# Altium footprint library 04.连接器件.pcb.PCBLIB: 363 footprints (part 8 of 23)
Each footprint in its own frame and in the unit in brackets; x right, y up, seen from the top. Pads: shape width x height; smd on the part's side, far side on the other; paste and mask are expansions set on the pad; w line width, h text height; cw(c..) or ccw(c..) is an arc to the next point about the centre after c.
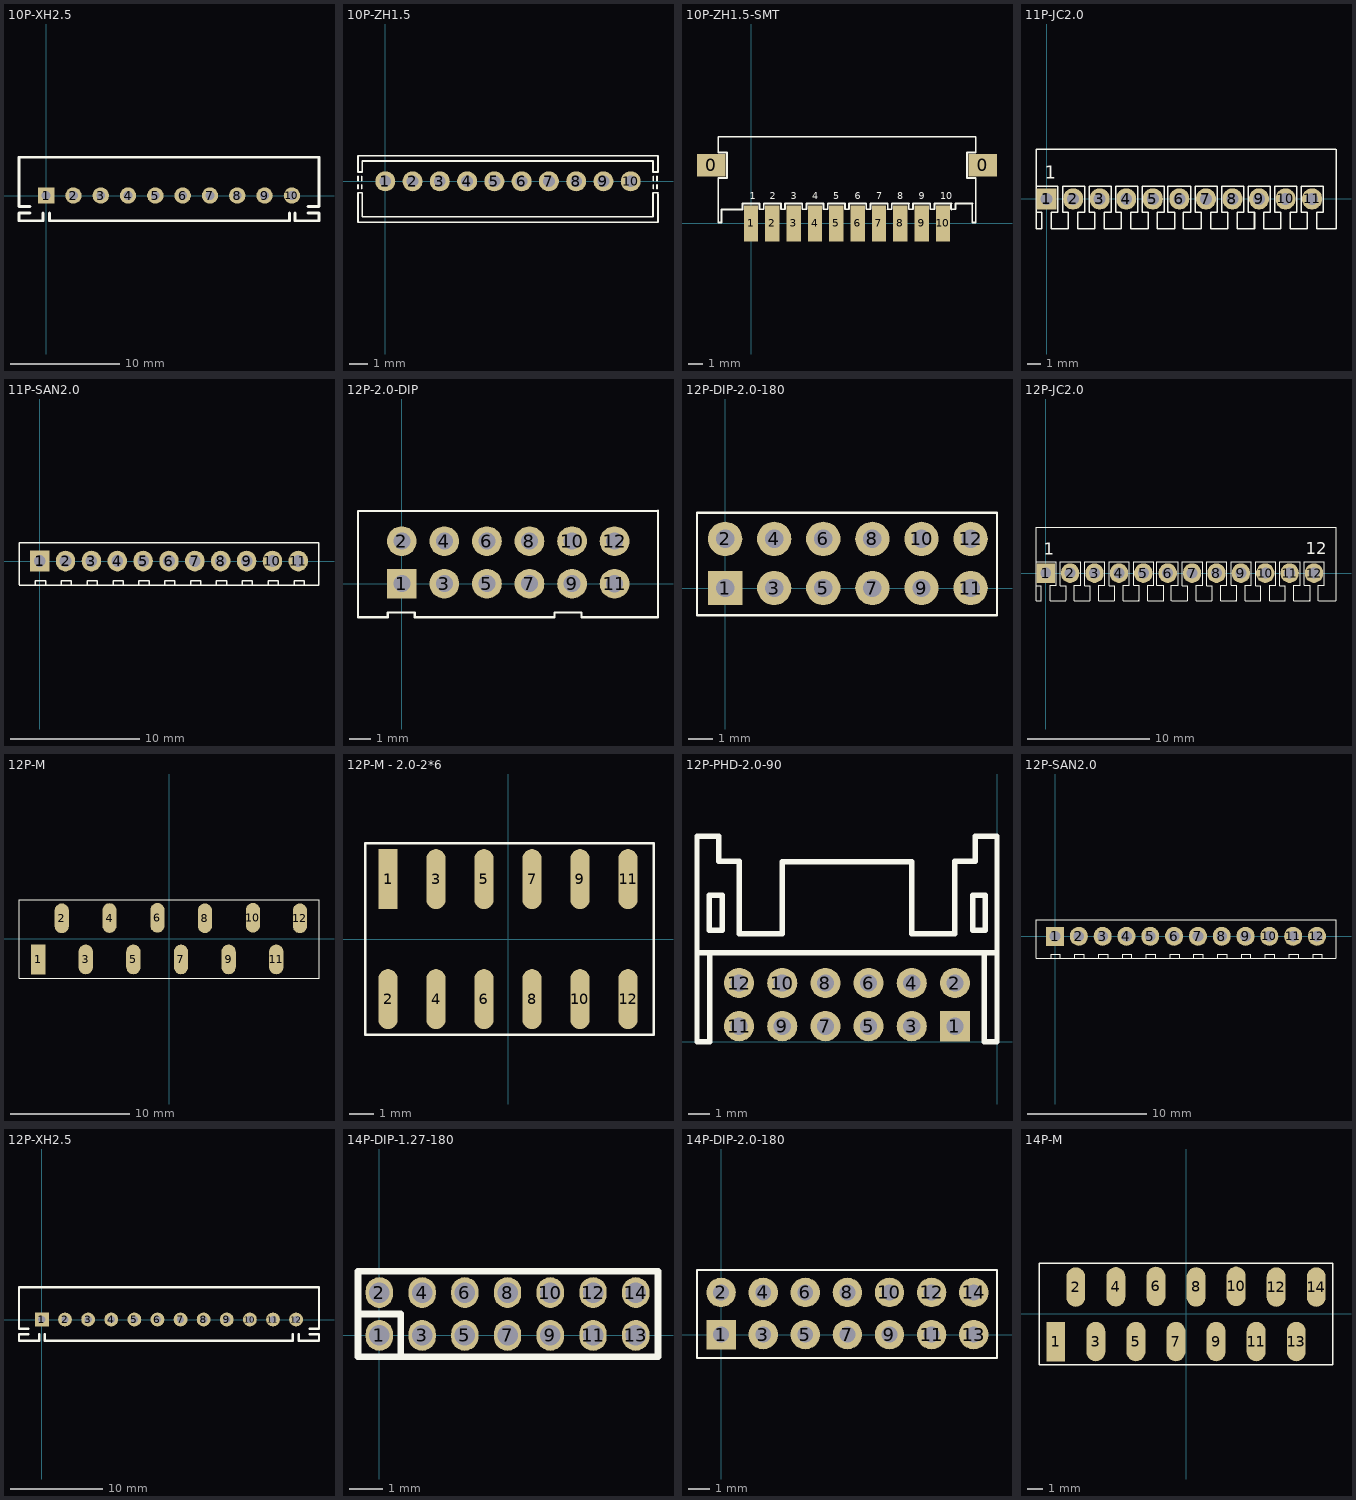
[diagram p7: the footprints below, top view; thin cyan lines are the x and y axes]

## 10P-XH2.5 [mm]
pads (10):
  rect 1.5x1.5 hole 0.8: 1(0,0)
  round 1.5 hole 0.8: 2(2.5,0) 3(5,0) 4(7.5,0) 5(10,0) 6(12.5,0) 7(15,0) 8(17.5,0) 9(20,0) 10(22.5,0)
TopOverlay:
  lines w0.254: -1.48,-1.6 -2.48,-1.6 -2.48,-2.3 -0.58,-2.3 ; -1.48,-1 -2.48,-1 -2.48,3.5 5.02,3.5 ; -0.88,-2.3 -0.28,-2.3 -0.28,-1.6 ; 0.32,-1.6 0.32,-2.3 0.62,-2.3 1.62,-2.3 22.12,-2.3 ; 4.42,3.5 24.943,3.5 ; 22.02,-2.3 22.276,-2.3 22.276,-1.6 ; 22.78,-1.6 22.78,-2.3 23.38,-2.3 ; 23.08,-2.3 24.98,-2.3 24.98,-1.6 23.98,-1.6 ; 23.98,-1 24.98,-1 24.98,3.5
3D body "10PIN-XH2.5.STEP": height 5.9, standoff -3.47, extent -2.54,-2.286 24.86,3.464

## 10P-ZH1.5 [mm]
pads (10):
  round 1.1 hole 0.65: 1(0,0) 2(1.5,0) 3(3,0) 4(4.5,0) 5(6,0) 6(7.5,0) 7(9,0) 8(10.5,0) 9(12,0) 10(13.5,0)
TopOverlay:
  lines w0.1: -1.499,-0.406 -1.499,-0.203 ; -1.499,0.051 -1.499,0.279 ; -1.295,-0.406 -1.295,-0.203 ; -1.295,0.051 -1.295,0.279 ; 14.742,-0.406 14.742,-0.203 ; 14.742,0.051 14.742,0.279 ; 14.945,-0.406 14.945,-0.203 ; 14.945,0.051 14.945,0.279 ; 14.991,1.4 15,1.391 15,0.508 14.716,0.508 14.716,1.118 -1.27,1.118 -1.27,0.508 -1.5,0.508 -1.5,1.4 15,1.4 ; 15,-0.682 15,-2.25 -1.5,-2.25 -1.5,-0.635 -1.27,-0.635 -1.27,-1.956 14.716,-1.956 14.716,-0.635 15,-0.635
3D body "10P-ZH1.5.STEP": height 4.6, standoff -2.45, extent -1.544,-2.261 14.956,1.389

## 10P-ZH1.5-SMT [mm]
pads (12):
  rect 2x1.6 smd: 0(-2.8,4.1) 0(16.3,4.1)
  rect 1x2.5 smd: 1(0,0) 2(1.5,0) 3(3,0) 4(4.5,0) 5(6,0) 6(7.5,0) 7(9,0) 8(10.5,0) 9(12,0) 10(13.5,0)
TopOverlay:
  lines w0.1: 8.1,1 8.1,1.4 ; 9.6,1 9.6,1.4 ; 11.1,1 11.1,1.4 ; 12.599,1 12.599,1.399 ; 15.57,0.07 15.57,1.398
  lines w0.127: 8.1,1 8.4,1 ; 8.1,1.4 6.9,1.4 6.9,1 6.6,1 6.6,1.4 5.4,1.4 5.4,1 5.1,1 5.1,1.4 3.9,1.4 3.9,1 3.6,1 3.6,1.4 2.4,1.4 2.4,1 2.1,1 2.1,1.4 0.9,1.4 0.9,1 0.6,1 0.6,1.4 -0.6,1.4 -0.6,1 -0.61,0.99 -2.07,0.99 -2.07,0.07 -2.3,0.07 -2.3,3.2 -1.7,3.2 -1.7,5 -2.3,5 -2.3,6.1 11.2,6.1 12.8,6.1 ; 9.6,1 9.9,1 ; 11.1,1 11.4,1 11.4,1.4 12.6,1.4 ; 12.599,1 12.899,1 12.899,1.4 14.099,1.4 ; 12.7,6.1 15.773,6.1 ; 14.072,1.4 14.072,1 ; 15.57,0.07 15.8,0.07 15.8,3.2 15.2,3.2 15.2,5 15.8,5 15.8,6.1 ; 15.572,1.4 14.372,1.4 14.372,1 14.072,1 ; 8.4,1 8.4,1.4 ; 8.4,1 8.4,1.4 ; 8.4,1.4 9.6,1.4 8.4,1.4 ; 9.9,1 9.9,1.4 ; 9.9,1 9.9,1.4 ; 9.9,1 9.9,1.4 ; 9.9,1.4 11.1,1.4 ; 9.9,1.4 11.1,1.4 ; 9.9,1.4 11.1,1.4 ; 14.072,1 14.082,0.99 ; 14.072,1 14.082,0.99 ; 14.072,1 14.082,0.99 ; 14.099,1 14.109,0.99 14.099,1
  text "8" at 10.3,1.7 h0.5
  text "5" at 5.8,1.7 h0.5
  text "4" at 4.3,1.7 h0.5
  text "3" at 2.8,1.7 h0.5
  text "2" at 1.3,1.7 h0.5
  text "1" at -0.1,1.7 h0.5
  text "7" at 8.8,1.7 h0.5
  text "6" at 7.3,1.7 h0.5
  text "9" at 11.8,1.7 h0.5
  text "10" at 13.299,1.7 h0.5
3D body "10P-ZH1.5-SMT.STEP": height 3.7, standoff -0.25, extent -2.337,-0.483 15.663,6.017

## 11P-JC2.0 [mm]
pads (11):
  rect 1.5x1.6 hole 0.9: 1(0,0)
  oval 1.5x1.6 hole 0.9: 2(2,0) 3(4,0) 4(6,0) 5(8,0) 6(10,0) 7(12,0) 8(14,0) 9(16,0) 10(18,0) 11(20,0)
TopOverlay:
  lines w0.1: 1.623,-2.25 0.349,-2.25 0.349,-0.991 0.857,-0.991 0.857,0.94 -0.8,0.94 ; 1.638,-2.235 1.638,-1.016 1.2,-1.016 1.2,0.94 2.857,0.94 2.857,-0.991 2.349,-0.991 2.349,-2.25 3.2,-2.25 3.623,-2.25 3.638,-2.235 3.638,-1.016 3.2,-1.016 3.2,0.94 4.857,0.94 4.857,-0.991 4.349,-0.991 4.349,-2.25 5.623,-2.25 5.638,-2.235 5.638,-1.016 5.2,-1.016 5.2,0.94 6.857,0.94 6.857,-0.991 6.349,-0.991 6.349,-2.25 7.67,-2.25 7.67,-0.991 7.2,-0.991 7.2,0.94 8.857,0.94 8.857,-0.991 8.349,-0.991 8.349,-2.25 9.67,-2.25 9.67,-0.991 9.111,-0.991 9.111,0.94 10.864,0.94 10.864,-0.991 10.305,-0.991 ; 7.623,-2.25 7.638,-2.235 ; 10.289,-2.25 10.289,-1.005 ; 10.349,-2.25 11.2,-2.25 11.623,-2.25 11.638,-2.235 11.638,-1.016 11.2,-1.016 11.2,0.94 12.857,0.94 12.857,-0.991 12.349,-0.991 12.349,-2.25 13.623,-2.25 13.638,-2.235 13.638,-1.016 13.2,-1.016 13.2,0.94 14.857,0.94 14.857,-0.991 14.349,-0.991 14.349,-2.25 15.67,-2.25 15.67,-0.991 15.2,-0.991 15.2,0.94 16.857,0.94 ; 10.349,-0.991 10.857,-0.991 10.857,0.94 ; 15.623,-2.25 15.638,-2.235 15.638,-1.016 ; 21.793,3.75 -0.8,3.75 -0.8,0.94 ; 21.8,3.75 21.8,-2.228 21.778,-2.25 20.349,-2.25 20.349,-0.991 20.857,-0.991 20.857,0.94 19.2,0.94 19.2,-1.016 19.638,-1.016 19.638,-2.235 19.623,-2.25 18.349,-2.25 18.349,-0.991 18.857,-0.991 18.857,0.94 17.2,0.94 17.2,-1.016 17.638,-1.016 17.638,-2.235 17.623,-2.25 17.2,-2.25 16.349,-2.25 ; -0.8,-1.016 -0.8,-2.25 -0.377,-2.25 -0.362,-2.235 -0.362,-1.016 -0.8,-1.016 ; -0.8,-1.016 -0.8,0.94 ; 16.349,-2.25 16.349,-0.991 ; 16.349,-2.25 16.349,-0.991 ; 16.349,-0.991 16.857,-0.991 ; 16.349,-0.991 16.857,-0.991 ; 16.857,-0.991 16.857,0.94 ; 16.857,-0.991 16.857,0.94
  text "1" at -0.152,1.524 h1
3D body "11P-JC2.0.STEP": height 3.4, standoff -3.22, extent -1.219,-7.163 21.281,3.837

## 11P-SAN2.0 [mm]
pads (11):
  rect 1.5x1.6 hole 0.9: 1(0,0)
  oval 1.5x1.6 hole 0.9: 2(2,0) 3(4,0) 4(6,0) 5(8,0) 6(10,0) 7(12,0) 8(14,0) 9(16,0) 10(18,0) 11(20,0)
TopOverlay:
  lines w0.1: -1.6,-1.85 -1.6,1.4 21.59,1.4 ; -1.575,-1.854 21.565,-1.854 ; -0.33,-1.85 -0.33,-1.524 0.457,-1.524 0.457,-1.85 ; 1.67,-1.85 1.67,-1.524 2.457,-1.524 2.457,-1.85 ; 3.67,-1.85 3.67,-1.524 4.457,-1.524 4.457,-1.85 ; 5.67,-1.85 5.67,-1.524 6.457,-1.524 6.457,-1.85 ; 7.67,-1.85 7.67,-1.524 8.457,-1.524 8.457,-1.85 ; 9.67,-1.85 9.67,-1.524 10.457,-1.524 10.457,-1.85 ; 11.67,-1.85 11.67,-1.524 12.457,-1.524 12.457,-1.85 ; 13.67,-1.85 13.67,-1.524 14.457,-1.524 14.457,-1.85 ; 15.67,-1.85 15.67,-1.524 16.457,-1.524 16.457,-1.85 ; 17.67,-1.85 17.67,-1.524 18.457,-1.524 18.457,-1.85 ; 19.67,-1.85 19.67,-1.524 20.457,-1.524 20.457,-1.85 ; 21.592,-1.85 21.6,-1.842 ; 21.601,-1.854 21.601,1.397
3D body "11P-SAN2.0.STEP": height 11, standoff -3.19, extent -1.6,-1.88 21.6,1.37

## 12P-2.0-DIP [mm]
pads (12):
  rect 1.4x1.4 hole 0.8: 1(0,0)
  round 1.4 hole 0.8: 2(0,2) 3(2,0) 4(2,2) 5(4,0) 6(4,2) 7(6,0) 8(6,2) 9(8,0) 10(8,2) 11(10,0) 12(10,2)
TopOverlay:
  lines w0.1: -2.057,-1.575 -0.66,-1.575 -0.66,-1.346 0.61,-1.346 0.61,-1.575 7.182,-1.575 7.182,-1.346 8.452,-1.346 8.452,-1.575 12.04,-1.575 12.04,3.43 -2.057,3.425 -2.057,-1.575
3D body: height 6.5, standoff 0, extent -2.057,-1.575 12.04,3.43

## 12P-DIP-2.0-180 [mm]
pads (12):
  rect 1.4x1.4 hole 0.75: 1(0,0)
  round 1.4 hole 0.75: 2(0,2) 3(2,0) 4(2,2) 5(4,0) 6(4,2) 7(6,0) 8(6,2) 9(8,0) 10(8,2) 11(10,0) 12(10,2)
TopOverlay:
  lines w0.1: -1.143,-1.118 11.074,-1.118 11.074,3.073 -1.143,3.073 -1.143,-1.118

## 12P-JC2.0 [mm]
pads (12):
  rect 1.5x1.6 hole 0.9: 1(0,0)
  oval 1.5x1.6 hole 0.9: 2(2,0) 3(4,0) 4(6,0) 5(8,0) 6(10,0) 7(12,0) 8(14,0) 9(16,0) 10(18,0) 11(20,0) 12(22,0)
TopOverlay:
  lines w0.1: 1.623,-2.25 0.349,-2.25 0.349,-0.991 0.857,-0.991 0.857,0.94 -0.8,0.94 ; 1.638,-2.235 1.638,-1.016 1.2,-1.016 1.2,0.94 2.857,0.94 2.857,-0.991 2.349,-0.991 2.349,-2.25 3.2,-2.25 3.623,-2.25 3.638,-2.235 3.638,-1.016 3.2,-1.016 3.2,0.94 4.857,0.94 4.857,-0.991 4.349,-0.991 4.349,-2.25 5.623,-2.25 5.638,-2.235 5.638,-1.016 5.2,-1.016 5.2,0.94 6.857,0.94 6.857,-0.991 6.349,-0.991 6.349,-2.25 7.67,-2.25 7.67,-0.991 7.2,-0.991 7.2,0.94 8.857,0.94 8.857,-0.991 8.349,-0.991 8.349,-2.25 9.67,-2.25 9.67,-0.991 9.111,-0.991 9.111,0.94 10.864,0.94 10.864,-0.991 10.305,-0.991 ; 7.623,-2.25 7.638,-2.235 ; 10.289,-2.25 10.289,-1.005 ; 10.349,-2.25 11.2,-2.25 11.623,-2.25 11.638,-2.235 11.638,-1.016 11.2,-1.016 11.2,0.94 12.857,0.94 12.857,-0.991 12.349,-0.991 12.349,-2.25 13.623,-2.25 13.638,-2.235 13.638,-1.016 13.2,-1.016 13.2,0.94 14.857,0.94 14.857,-0.991 14.349,-0.991 14.349,-2.25 15.67,-2.25 15.67,-0.991 15.2,-0.991 15.2,0.94 16.857,0.94 ; 10.349,-0.991 10.857,-0.991 10.857,0.94 ; 15.623,-2.25 15.638,-2.235 15.638,-1.016 ; 21.2,-2.25 21.623,-2.25 21.638,-2.235 ; 22.349,-2.25 22.349,-0.991 22.857,-0.991 22.857,0.94 21.2,0.94 21.2,-0.991 21.67,-0.991 21.67,-2.25 20.349,-2.25 20.349,-0.991 20.857,-0.991 20.857,0.94 19.2,0.94 19.2,-1.016 19.638,-1.016 19.638,-2.235 19.623,-2.25 18.349,-2.25 18.349,-0.991 18.857,-0.991 18.857,0.94 17.2,0.94 17.2,-1.016 17.638,-1.016 17.638,-2.235 17.623,-2.25 17.2,-2.25 16.349,-2.25 ; 22.38,-2.25 23.79,-2.25 ; 23.8,-2.25 23.8,3.75 -0.8,3.75 -0.8,0.94 ; -0.8,-1.016 -0.362,-1.016 -0.362,-2.235 -0.377,-2.25 -0.8,-2.25 -0.8,-1.016 ; -0.8,-1.016 -0.8,0.94 ; 16.349,-2.25 16.349,-0.991 ; 16.349,-2.25 16.349,-0.991 ; 16.349,-0.991 16.857,-0.991 ; 16.349,-0.991 16.857,-0.991 ; 16.857,-0.991 16.857,0.94 ; 16.857,-0.991 16.857,0.94
  text "12" at 21.336,1.549 h1
  text "1" at -0.152,1.524 h1
3D body "12P-JC2.0.STEP": height 3.4, standoff -3.22, extent -1.245,-7.214 23.255,3.786

## 12P-M [mm]
pads (12):
  rect 1.2x2.5 smd: 1(-10.995,-1.748)
  oval 1.2x2.5 smd: 2(-9.009,1.703) 3(-6.995,-1.748) 4(-4.998,1.721) 5(-2.995,-1.748) 6(-0.972,1.744) 7(1.005,-1.748) 8(3.017,1.712) 9(5.005,-1.748) 10(7.047,1.748) 11(9.005,-1.748) 12(10.995,1.703)
TopLayer:
  lines w0.1: 3.008,2.703 3.017,1.712 ; 7.008,2.481 7.047,1.748
TopOverlay:
  lines w0.1: 12.59,-0.371 12.598,-0.379 ; -12.602,-3.315 -12.602,3.247 12.599,3.247 12.599,-3.315 -12.602,-3.315
3D body "12P-SAN2.0.STEP": height 11, standoff -3.19, extent -12.68,-1.706 12.52,1.543

## 12P-M - 2.0-2*6 [mm]
pads (12):
  rect 0.8x2.5 smd: 1(-5,2.5)
  oval 0.8x2.5 smd: 2(-5,-2.5) 3(-3,2.5) 4(-3,-2.5) 5(-1,2.5) 6(-1,-2.5) 7(1,2.5) 8(1,-2.5) 9(3,2.5) 10(3,-2.5) 11(5,2.5) 12(5,-2.5)
TopOverlay:
  lines w0.1: -5.951,-3.989 -5.951,4.003 6.078,4.003 6.078,-3.989 -5.951,-3.989
3D body: height 4.5, standoff 0, extent -5.951,-3.989 6.078,4.003

## 12P-PHD-2.0-90 [mm]
pads (12):
  rect 1.4x1.4 hole 0.8: 1(-1.95,0.711)
  round 1.4 hole 0.8: 2(-1.95,2.711) 3(-3.95,0.711) 4(-3.95,2.711) 5(-5.95,0.711) 6(-5.95,2.711) 7(-7.95,0.711) 8(-7.95,2.711) 9(-9.95,0.711) 10(-9.95,2.711) 11(-11.95,0.711) 12(-11.95,2.711)
TopOverlay:
  lines w0.254: -13.9,4.115 -0.6,4.115 ; -13.3,4.115 -13.3,0 -13.9,0 -13.9,9.5 -12.9,9.5 -12.9,8.357 -11.95,8.357 -11.95,5.004 -9.95,5.004 -9.95,8.331 -3.95,8.331 -3.95,5.004 -1.95,5.004 -1.95,8.357 -1,8.357 -1,9.5 0,9.5 0,0 -0.6,0 -0.6,4.115 ; 0,4.115 -0.6,4.115 ; -13.322,5.156 -13.322,6.782 -12.737,6.782 -12.737,5.156 -13.322,5.156 ; -1.118,5.156 -1.118,6.782 -0.533,6.782 -0.533,5.156 -1.118,5.156
3D body: height 5, standoff 0, extent -13.9,0 0,9.5

## 12P-SAN2.0 [mm]
pads (12):
  rect 1.5x1.6 hole 0.9: 1(0,0)
  oval 1.5x1.6 hole 0.9: 2(2,0) 3(4,0) 4(6,0) 5(8,0) 6(10,0) 7(12,0) 8(14,0) 9(16,0) 10(18,0) 11(20,0) 12(22,0)
TopOverlay:
  lines w0.1: -1.6,-1.85 -1.6,1.4 23.597,1.4 ; -1.575,-1.854 23.597,-1.854 ; -0.33,-1.85 -0.33,-1.524 0.457,-1.524 0.457,-1.85 ; 1.67,-1.85 1.67,-1.524 2.457,-1.524 2.457,-1.85 ; 3.67,-1.85 3.67,-1.524 4.457,-1.524 4.457,-1.85 ; 5.67,-1.85 5.67,-1.524 6.457,-1.524 6.457,-1.85 ; 7.67,-1.85 7.67,-1.524 8.457,-1.524 8.457,-1.85 ; 9.67,-1.85 9.67,-1.524 10.457,-1.524 10.457,-1.85 ; 11.67,-1.85 11.67,-1.524 12.457,-1.524 12.457,-1.85 ; 13.67,-1.85 13.67,-1.524 14.457,-1.524 14.457,-1.85 ; 15.67,-1.85 15.67,-1.524 16.457,-1.524 16.457,-1.85 ; 17.67,-1.85 17.67,-1.524 18.457,-1.524 18.457,-1.85 ; 19.67,-1.85 19.67,-1.524 20.457,-1.524 20.457,-1.85 ; 21.67,-1.85 21.67,-1.524 22.457,-1.524 22.457,-1.85 ; 23.592,-1.85 23.6,-1.842 ; 23.601,-1.854 23.601,1.397
3D body "12P-SAN2.0.STEP": height 11, standoff -3.19, extent -1.6,-1.854 23.6,1.396

## 12P-XH2.5 [mm]
pads (12):
  rect 1.5x1.5 hole 0.8: 1(0,0)
  round 1.5 hole 0.8: 2(2.5,0) 3(5,0) 4(7.5,0) 5(10,0) 6(12.5,0) 7(15,0) 8(17.5,0) 9(20,0) 10(22.5,0) 11(25,0) 12(27.5,0)
TopOverlay:
  lines w0.254: -1.48,-1.6 -2.48,-1.6 -2.48,-2.3 -0.58,-2.3 ; -1.48,-1 -2.48,-1 -2.48,3.5 5.02,3.5 29.947,3.5 ; -0.88,-2.3 -0.28,-2.3 -0.28,-1.6 ; 0.32,-1.6 0.32,-2.3 0.62,-2.3 1.62,-2.3 27.127,-2.3 27.127,-1.575 ; 27.78,-1.6 27.78,-2.3 28.38,-2.3 ; 28.08,-2.3 29.98,-2.3 29.98,-1.6 28.98,-1.6 ; 28.98,-1 29.98,-1 29.98,3.5
3D body "12PIN-XH2.5.STEP": height 5.9, standoff -3.47, extent -2.54,-2.337 29.86,3.413

## 14P-DIP-1.27-180 [mil]
pads (14):
  oval 32x36 hole 24: 1(0,0) 2(0,50) 3(50,0) 4(50,50) 5(100,0) 6(100,50) 7(150,0) 8(150,50) 9(200,0) 10(200,50) 11(250,0) 12(250,50) 13(300,0) 14(300,50)
TopOverlay:
  lines w8: -25,25 25,25 25,-25 ; -25,-25 326,-25 326,75 -25,75 -25,-25

## 14P-DIP-2.0-180 [mm]
pads (14):
  rect 1.4x1.4 hole 0.75: 1(0,0)
  round 1.4 hole 0.75: 2(0,2) 3(2,0) 4(2,2) 5(4,0) 6(4,2) 7(6,0) 8(6,2) 9(8,0) 10(8,2) 11(10,0) 12(10,2) 13(12,0) 14(12,2)
TopOverlay:
  lines w0.1: -1.143,-1.118 -1.143,3.073 13.106,3.073 13.106,-1.118 -1.143,-1.118
3D body "DIP14(2.0)排针.": height 8, standoff -2.6, extent -1.041,-1.016 12.959,2.984

## 14P-M [mm]
pads (14):
  rect 1.2x2.5 smd: 1(-8.255,-1.748)
  oval 1.2x2.5 smd: 2(-6.985,1.703) 3(-5.715,-1.748) 4(-4.445,1.721) 5(-3.175,-1.748) 6(-1.905,1.744) 7(-0.635,-1.748) 8(0.635,1.712) 9(1.905,-1.748) 10(3.175,1.748) 11(4.445,-1.748) 12(5.715,1.703) 13(6.985,-1.748) 14(8.255,1.703)
TopOverlay:
  lines w0.1: -9.305,-3.217 9.308,-3.217 9.308,3.212 -9.305,3.212 -9.305,-3.217
3D body: height 4.5, standoff 0, extent -9.305,-3.217 9.308,3.212